# Altium footprint library Derogarian_Library.PcbLib: 99 footprints (part 4 of 7)
Each footprint in its own frame and in the unit in brackets; x right, y up, seen from the top. Pads: shape width x height; smd on the part's side, far side on the other; paste and mask are expansions set on the pad; w line width, h text height; cw(c..) or ccw(c..) is an arc to the next point about the centre after c.
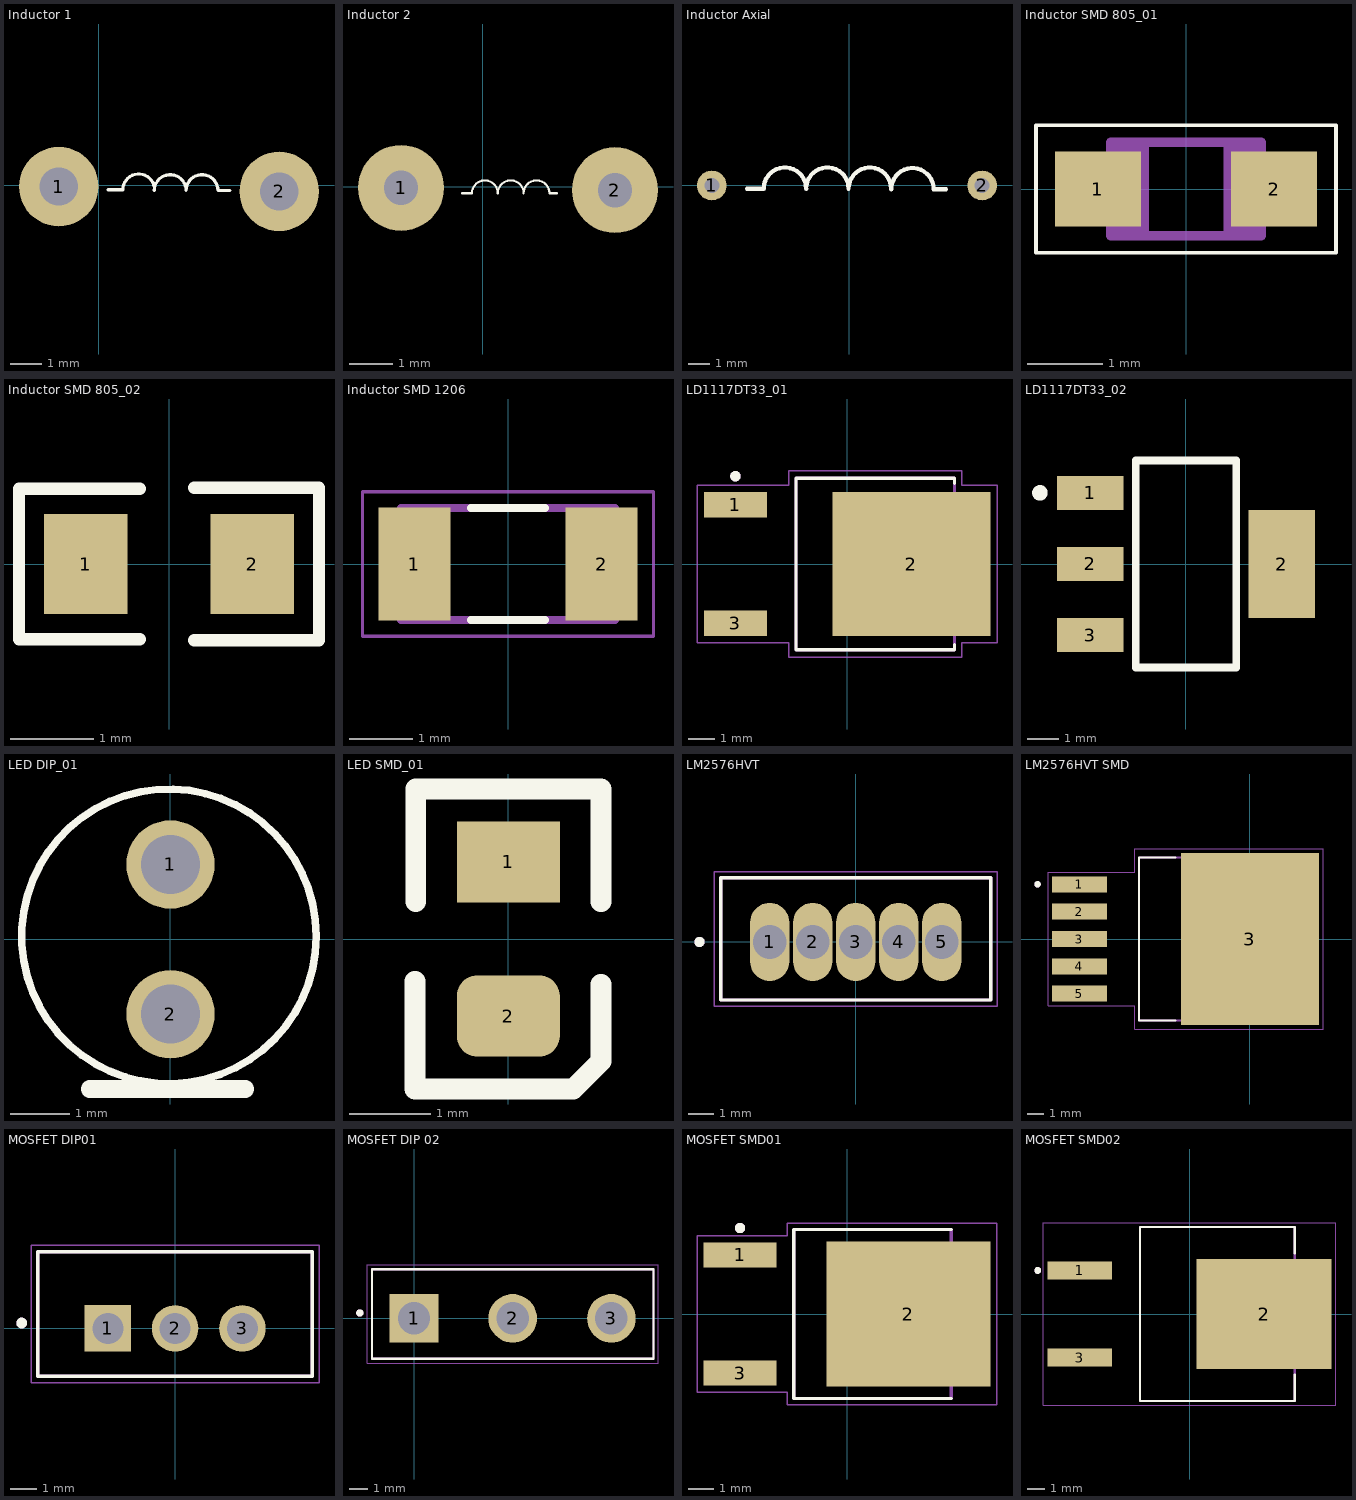
[diagram p3: the footprints below, top view; thin cyan lines are the x and y axes]

## Inductor 1 [mm] "Through Hole  Inductor"
height 2.54
pads (2):
  round 2.5 hole 1.2: 1(-1.25,-0.05) 2(5.675,-0.2)
Top Overlay:
  lines w0.1: 0.3,-0.15 0.75,-0.15 ; 0.761,-0.152 cw(c1.261,-0.152) 1.761,-0.152 ; 1.75,-0.175 cw(c2.25,-0.175) 2.75,-0.175 cw(c3.25,-0.175) 3.75,-0.175 4.125,-0.175
3D body "7447016.stp": height 18.82, standoff -12.8, extent -1.895,-8.869 6.645,8.518

## Inductor 2 [mm] "Through Hole  Inductor"
height 2.54
pads (2):
  round 2 hole 0.8: 1(-1.9,-0.025) 2(3.075,-0.075)
Top Overlay:
  lines w0.05: -0.475,-0.15 -0.25,-0.15 cw(c0.05,-0.15) 0.35,-0.15 cw(c0.65,-0.15) 0.95,-0.15 cw(c1.25,-0.15) 1.55,-0.15 1.725,-0.15
3D body "User Library-Inductors  9x11.STEP": height 11.16, standoff -3, extent -3.434,-4.168 4.634,3.9

## Inductor Axial [mm] "Through Hole Axial Inductor"
height 2.54
pads (2):
  round 1.4 hole 0.7: 1(-6.477,0) 2(6.248,0)
Top Overlay:
  lines w0.2: -4.826,-0.152 -4.04,-0.152 ; -4.039,-0.152 cw(c-3.039,-0.152) -2.039,-0.152 cw(c-1.039,-0.152) -0.039,-0.152 cw(c0.961,-0.152) 1.961,-0.152 ; 1.968,-0.178 cw(c2.968,-0.178) 3.968,-0.178 ; 3.962,-0.178 4.547,-0.178
3D body "User Library-Axial SMT Inductor Right Angle.STEP": height 4.95, standoff -4, extent -6.776,-1.147 6.624,3.353

## Inductor SMD 805_01 [mm]
pads (2):
  rect 1.15x1 smd: 1(-1.175,0) 2(1.175,0)
Top Overlay:
  lines w0.051: -2,-0.85 -2,0.85 2,0.85 2,-0.85 -2,-0.85
Mechanical 13:
  region: 1,-0.626 0.501,-0.626 0.501,0.625 1,0.625
  region: -0.5,-0.626 -1.001,-0.626 -1.001,0.625 -0.5,0.625
  lines w0.127: -1,-0.625 -1,0.625 1,0.625 1,-0.625 -1,-0.625
3D body "MLF2012K390M.STEP": height 1.04, standoff -0.01, extent -0.924,-0.6 1.076,0.65

## Inductor SMD 805_02 [mm]
pads (2):
  rect 1x1.2 smd: 1(-1,0) 2(1,0)
Top Overlay:
  lines w0.15: -0.35,-0.9 -1.8,-0.9 -1.8,0.9 -0.35,0.9 ; 0.3,-0.916 1.8,-0.916 1.8,0.916 0.3,0.916
3D body "User Library-RES_2013-0805.STEP": height 0.76, standoff 0, extent -1.15,-0.675 1.15,0.675

## Inductor SMD 1206 [mm] "SMD 1206"
pads (2):
  rect 1.13x1.77 smd: 1(-1.47,0) 2(1.47,0)
Top Overlay:
  lines w0.127: -0.58,-0.88 0.58,-0.88 ; -0.58,0.88 0.58,0.88
Mechanical 13:
  lines w0.127: -1.68,-0.88 -1.68,0.88 1.68,0.88 1.68,-0.88 -1.68,-0.88
Mechanical 15:
  lines w0.05: -2.285,-1.135 -2.285,1.135 2.285,1.135 2.285,-1.135 -2.285,-1.135
3D body "User Library-RESC3216X06N.STEP": height 0.55, standoff 0, extent -1.625,-0.774 1.575,0.826

## LD1117DT33_01 [mm] "Linear Regulator"
pads (3):
  rect 2.44x0.97 smd: 1(-4.29,2.28) 3(-4.29,-2.28)
  rect 6.07x5.55 smd paste-4: 2(2.48,0)
Top Overlay:
  circle w0.2: c-4.293,3.378 r0.1
  lines w0.127: 4.135,-3.095 4.135,-3.3 -1.965,-3.3 -1.965,3.3 4.135,3.3 4.135,3.095
Top Paste:
  region: 5.3,-2.355 3.84,-2.355 3.84,-0.425 5.3,-0.425
  region: 5.3,0.425 3.84,0.425 3.84,2.355 5.3,2.355
  region: 3.27,-2.355 1.81,-2.355 1.81,-0.425 3.27,-0.425
  region: 3.27,0.425 1.81,0.425 1.81,2.355 3.27,2.355
  region: 1.24,-2.355 -0.22,-2.355 -0.22,-0.425 1.24,-0.425
  region: 1.24,0.425 -0.22,0.425 -0.22,2.355 1.24,2.355
Mechanical 13:
  circle w0.2: c-4.293,3.378 r0.1
  lines w0.127: -1.965,-3.3 4.135,-3.3 4.135,3.3 -1.965,3.3 -1.965,-3.3
Mechanical 15:
  lines w0.05: -5.77,-3.02 -2.24,-3.02 -2.24,-3.58 4.41,-3.58 4.41,-3.03 5.77,-3.03 5.77,3.03 4.41,3.03 4.41,3.58 -2.24,3.58 -2.24,3.02 -5.77,3.02 -5.77,-3.02
3D body "User Library-TO252AA.STEP": height 2.3, standoff -0.01, extent -5.307,-3.278 4.393,3.302

## LD1117DT33_02 [mm] "Linear Regulator"
pads (4):
  rect 2.15x1.1 smd: 1(-3.1,2.3) 2(-3.1,0) 3(-3.1,-2.3)
  rect 2.15x3.5 smd: 2(3.1,0)
Top Overlay:
  circle w0.25: c-4.725,2.3 r0.125
  lines w0.254: -1.625,-3.35 -1.625,3.35 1.625,3.35 1.625,-3.35 -1.625,-3.35
3D body "CircuitWorks-SOT-223.STEP": height 1.9, standoff 0.22, extent -3.58,-3.35 3.38,3.15

## LED DIP_01 [mm] "Through Hole LED"
pads (2):
  round 1.5 hole 1: 1(0,1.27) 2(0,-1.27)
Top Overlay:
  circle w0.127: c-0.025,0.051 r2.5
  lines w0.3: -1.372,-2.54 1.27,-2.54
3D body "CircuitWorks-LED DIP 3MM.STEP": height 6.5, standoff -2, extent -1.93,-1.623 1.87,1.877

## LED SMD_01 [mm] "Through Hole LED"
pads (2):
  rect 1.27x1 smd: 1(0,0.95)
  rrect50% 1.27x1 smd: 2(0,-0.95)
Top Overlay:
  lines w0.254: -1.15,-0.522 -1.15,-1.85 0.8,-1.85 1.143,-1.507 1.143,-0.558 ; -1.143,0.458 -1.143,1.85 1.143,1.85 1.143,0.458
3D body "everlight-17-21-0805LED-GREEN.STEP": height 0.8, standoff -0.31, extent -0.625,-1.05 0.625,0.95

## LM2576HVT [mm] "LM2576HVT-15/NOPB-ND"
pads (5):
  oval 1.55x3.1 hole 1.34: 1(-3.4,0) 2(-1.7,0) 3(0,0) 4(1.7,0) 5(3.4,0)
Top Overlay:
  circle w0.2: c-6.175,0 r0.1
  lines w0.127: -5.335,-2.29 -5.335,2.54 5.335,2.54 5.335,-2.29 -5.335,-2.29
Mechanical 13:
  circle w0.2: c-6.175,0 r0.1
  lines w0.127: -5.335,-2.29 -5.335,2.54 5.335,2.54 5.335,-2.29 -5.335,-2.29
Mechanical 15:
  lines w0.05: -5.585,-2.54 -5.585,2.775 5.585,2.775 5.585,-2.54 -5.585,-2.54
3D body "step_temp.STEP": height 16.84, standoff -14.73, extent -4.851,-1.702 5.309,2.743

## LM2576HVT SMD [mm]
pads (6):
  rect 3.4x1 smd paste-0.05 mask+0.07: 1(-10.6,3.4) 2(-10.6,1.7) 3(-10.6,0) 4(-10.6,-1.7) 5(-10.6,-3.4)
  rect 8.6x10.7 smd paste-0.05 mask+0.07: 3(0,0)
Top Overlay:
  circle w0.2: c-13.2,3.4 r0.1
  lines w0.127: -4.62,-5.08 -6.905,-5.08 -6.905,5.08 -4.62,5.08
Mechanical 13:
  circle w0.2: c-13.2,3.4 r0.1
  lines w0.127: -6.905,-5.08 2.02,-5.08 2.02,5.08 -6.905,5.08 -6.905,-5.08
Mechanical 15:
  lines w0.05: -12.55,-4.15 -12.55,4.15 -7.155,4.15 -7.155,5.6 4.55,5.6 4.55,-5.6 -7.155,-5.6 -7.155,-4.15 -12.55,-4.15
3D body "LM2576S-12.STEP": height 4.65, standoff -0.15, extent -11.367,-5.105 2.984,5.055

## MOSFET DIP01 [mm]
pads (3):
  rect 1.755x1.755 hole 1.17: 1(-2.54,0)
  round 1.755 hole 1.17: 2(0,0) 3(2.54,0)
Top Overlay:
  circle w0.2: c-5.79,0.2 r0.1
  lines w0.127: -5.18,-1.81 5.18,-1.81 5.18,2.89 -5.18,2.89 -5.18,-1.81
Mechanical 13:
  circle w0.2: c-5.79,0.2 r0.1
  lines w0.127: -5.18,-1.81 5.18,-1.81 5.18,2.89 -5.18,2.89 -5.18,-1.81
Mechanical 15:
  lines w0.05: -5.43,-2.06 5.43,-2.06 5.43,3.14 -5.43,3.14 -5.43,-2.06
3D body "step_temp.STEP": height 19.65, standoff -9.22, extent -5.156,-1.629 5.004,2.921

## MOSFET DIP 02 [mm]
pads (3):
  rect 2.69x2.69 hole 1.79: 1(0,0)
  round 2.69 hole 1.79: 2(5.46,0) 3(10.92,0)
Top Overlay:
  circle w0.2: c-3,0.3 r0.1
  lines w0.127: -2.33,-2.235 -2.33,2.71 13.25,2.71 13.25,-2.235 -2.33,-2.235
Mechanical 13:
  circle w0.2: c-3,0.3 r0.1
  lines w0.127: -2.33,-2.235 -2.33,2.71 13.25,2.71 13.25,-2.235 -2.33,-2.235
Mechanical 15:
  lines w0.05: -2.58,-2.485 -2.58,2.965 13.5,2.965 13.5,-2.485 -2.58,-2.485
3D body "step_temp.STEP": height 30.1, standoff -5, extent -2.339,-2.587 13.261,2.413

## MOSFET SMD01 [mm]
pads (3):
  rect 2.83x0.97 smd: 1(-4.14,2.29) 3(-4.14,-2.29)
  rect 6.35x5.63 smd paste-4: 2(2.38,0)
Top Overlay:
  circle w0.2: c-4.14,3.325 r0.1
  lines w0.127: 4.03,-3.27 -2.065,-3.27 -2.065,3.27 4.03,3.27
Top Paste:
  region: 3.075,0.55 1.685,0.55 1.685,2.27 3.075,2.27
  region: 0.955,0.55 -0.435,0.55 -0.435,2.27 0.955,2.27
  region: 5.195,0.55 3.805,0.55 3.805,2.27 5.195,2.27
  region: 3.075,-2.27 1.685,-2.27 1.685,-0.55 3.075,-0.55
  region: 0.955,-2.27 -0.435,-2.27 -0.435,-0.55 0.955,-0.55
  region: 5.195,-2.27 3.805,-2.27 3.805,-0.55 5.195,-0.55
Mechanical 13:
  circle w0.2: c-4.14,3.325 r0.1
  lines w0.127: -2.065,-3.27 4.03,-3.27 4.03,3.27 -2.065,3.27 -2.065,-3.27
Mechanical 15:
  lines w0.05: -5.805,-3.025 -2.315,-3.025 -2.315,-3.52 5.805,-3.52 5.805,3.52 -2.315,3.52 -2.315,3.025 -5.805,3.025 -5.805,-3.025
3D body "FDD6690A.STEP": height 2.52, standoff 0, extent -5.41,-3.27 4.495,3.27

## MOSFET SMD02 [mm]
pads (3):
  rect 3.78x1.06 smd: 1(-6.4,2.54) 3(-6.4,-2.54)
  rect 7.88x6.39 smd paste-5: 2(4.35,0)
Top Overlay:
  circle w0.2: c-8.85,2.54 r0.1
  lines w0.127: 6.133,-3.52 6.133,-5.08 -2.888,-5.08 -2.888,5.08 6.133,5.08 6.133,3.52
Top Paste:
  region: 8.03,-2.85 6.58,-2.85 6.58,-1.41 8.03,-1.41
  region: 6.06,-2.85 4.61,-2.85 4.61,-1.41 6.06,-1.41
  region: 4.09,-2.85 2.64,-2.85 2.64,-1.41 4.09,-1.41
  region: 2.12,-2.85 0.67,-2.85 0.67,-1.41 2.12,-1.41
  region: 8.03,1.41 6.58,1.41 6.58,2.85 8.03,2.85
  region: 6.06,1.41 4.61,1.41 4.61,2.85 6.06,2.85
  region: 4.09,1.41 2.64,1.41 2.64,2.85 4.09,2.85
  region: 2.12,1.41 0.67,1.41 0.67,2.85 2.12,2.85
  region: 8.03,-0.72 6.58,-0.72 6.58,0.72 8.03,0.72
  region: 6.06,-0.72 4.61,-0.72 4.61,0.72 6.06,0.72
  region: 4.09,-0.72 2.64,-0.72 2.64,0.72 4.09,0.72
  region: 2.12,-0.72 0.67,-0.72 0.67,0.72 2.12,0.72
Mechanical 13:
  circle w0.2: c-8.85,2.54 r0.1
  lines w0.127: -2.888,-5.08 -2.888,5.08 6.133,5.08 6.133,-5.08 -2.888,-5.08
Mechanical 15:
  lines w0.05: -8.54,-5.33 -8.54,5.33 8.54,5.33 8.54,-5.33 -8.54,-5.33
3D body "step_temp.STEP": height 4.83, standoff -0.25, extent -7.874,-5.08 7.366,5.08